# Altium footprint library TempdevAmmy.PcbLib: 42 footprints (part 3 of 3)
Each footprint in its own frame and in the unit in brackets; x right, y up, seen from the top. Pads: shape width x height; smd on the part's side, far side on the other; paste and mask are expansions set on the pad; w line width, h text height; cw(c..) or ccw(c..) is an arc to the next point about the centre after c.
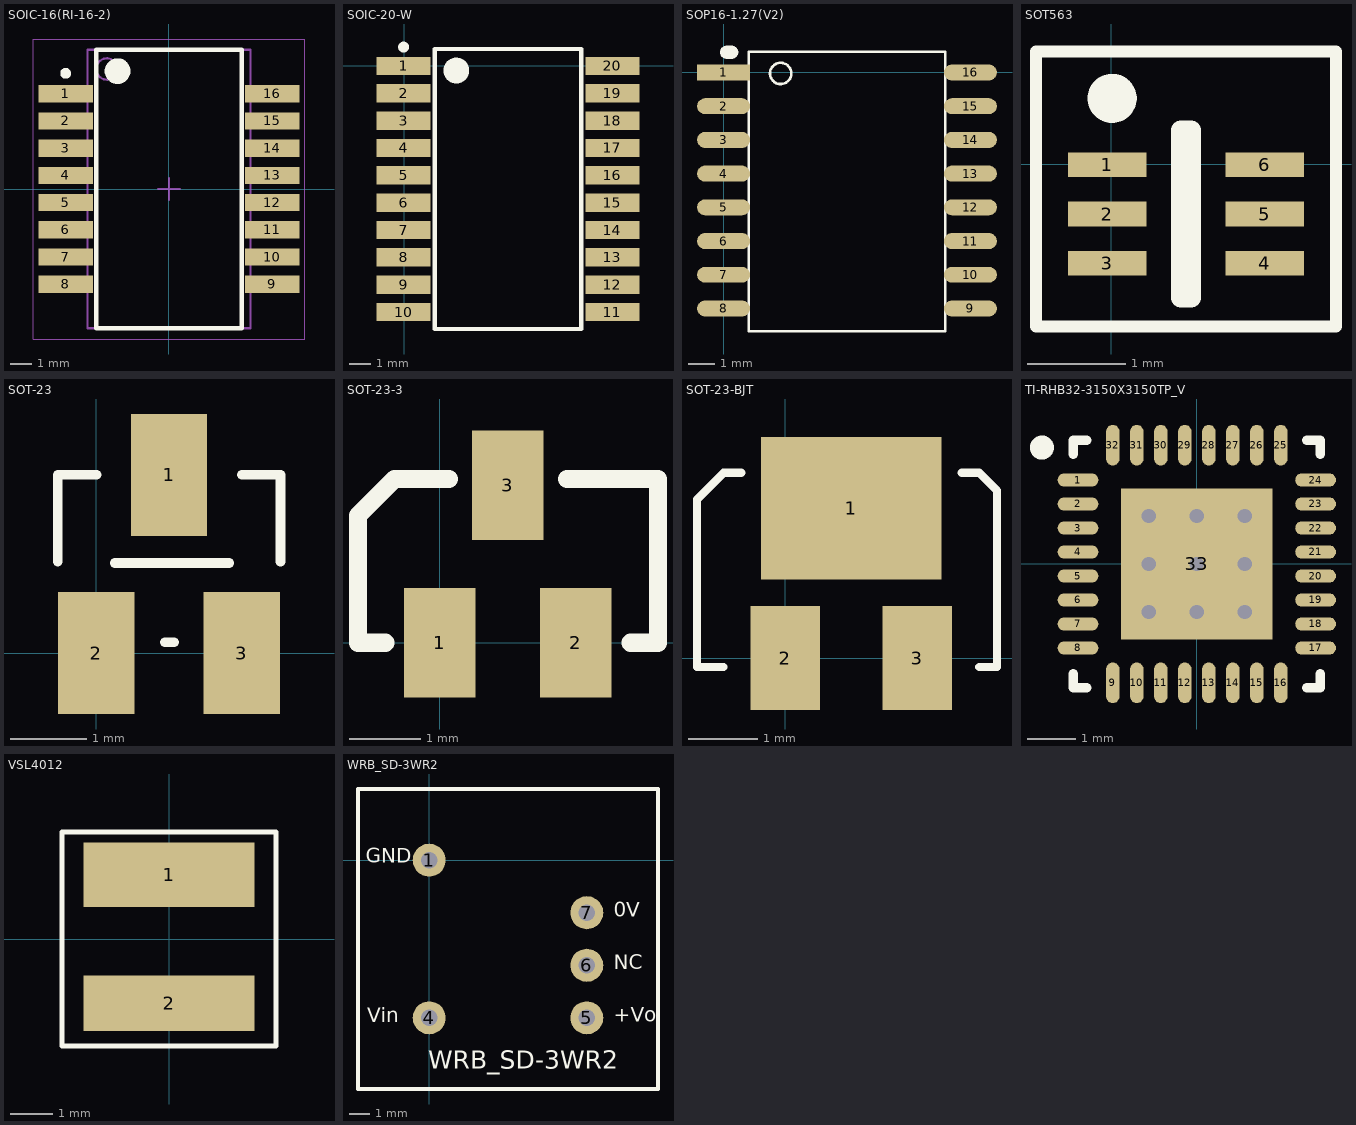
[diagram p2: the footprints below, top view; thin cyan lines are the x and y axes]

## SOIC-16(RI-16-2) [mm]
height 2.64
pads (16):
  rect 2.54x0.8 smd: 1(-4.825,4.445) 2(-4.825,3.175) 3(-4.825,1.905) 4(-4.825,0.635) 5(-4.825,-0.635) 6(-4.825,-1.905) 7(-4.825,-3.175) 8(-4.825,-4.445) 9(4.825,-4.445) 10(4.825,-3.175) 11(4.825,-1.905) 12(4.825,-0.635) 13(4.825,0.635) 14(4.825,1.905) 15(4.825,3.175) 16(4.825,4.445)
Top Overlay:
  circle w0.6: c-2.4,5.5 r0.3
  circle w0.25: c-4.825,5.395 r0.125
  lines w0.2: -3.4,-6.5 3.4,-6.5 3.4,6.5 -3.4,6.5 -3.4,-6.5
Mechanical 13:
  circle w0.1: c-2.9,5.6 r0.5
  lines w0.1: -3.8,-6.5 3.8,-6.5 3.8,6.5 -3.8,6.5 -3.8,-6.5
Mechanical 15:
  lines w0.05: -6.325,-7 6.325,-7 6.325,7 -6.325,7 -6.325,-7
  lines w0.1: -0.5,0 0.5,0 ; 0,-0.5 0,0.5
3D body "SOIC-16(RI-16-2).step": height 2.64, standoff 0, extent -5.15,-6.5 5.15,6.5

## SOIC-20-W [mm]
pads (20):
  rect 2.5x0.85 smd: 1(-0.024,0) 2(-0.024,-1.27) 3(-0.024,-2.54) 4(-0.024,-3.81) 5(-0.024,-5.08) 6(-0.024,-6.35) 7(-0.024,-7.62) 8(-0.024,-8.89) 9(-0.024,-10.16) 10(-0.024,-11.43) 11(9.676,-11.43) 12(9.676,-10.16) 13(9.676,-8.89) 14(9.676,-7.62) 15(9.676,-6.35) 16(9.676,-5.08) 17(9.676,-3.81) 18(9.676,-2.54) 19(9.676,-1.27) 20(9.676,0)
Top Overlay:
  circle w0.6: c2.426,-0.215 r0.3
  circle w0.25: c-0.024,0.875 r0.125
  lines w0.2: 1.426,-12.215 8.226,-12.215 8.226,0.785 1.426,0.785 1.426,-12.215

## SOP16-1.27(V2) [mm] "金升阳2"
pads (17):
  rect 2x0.6 smd: 1(0,0)
  oval 2x0.6 smd: 2(0,-1.27) 3(0,-2.54) 4(0,-3.81) 5(0,-5.08) 6(0,-6.35) 7(0,-7.62) 8(0,-8.89) 9(9.3,-8.89) 10(9.3,-7.62) 11(9.3,-6.35) 12(9.3,-5.08) 13(9.3,-3.81) 14(9.3,-2.54) 15(9.3,-1.27) 16(9.3,0)
  oval 0.7x0.5 on Top Overlay mask+0.051: ""(0.21,0.762)
Top Overlay:
  circle w0.1: c2.151,-0.037 r0.4
  lines w0.1: 0.95,-9.744 8.35,-9.744 8.35,0.785 0.95,0.785 0.95,-9.744

## SOT563 [mm]
pads (6):
  rect 0.8x0.25 smd: 1(-0.038,-0.008) 2(-0.038,-0.508) 3(-0.038,-1.008) 4(1.562,-1.008) 5(1.562,-0.508) 6(1.562,-0.008)
Top Overlay:
  circle w0.25: c0.012,0.667 r0.125
  lines w0.12: -0.762,-1.651 -0.762,1.143 2.286,1.143 2.286,-1.651 -0.762,-1.651
  lines w0.2: 0.712,-1.358 0.712,0.342 0.812,0.342 0.812,-1.358 0.712,-1.358
Mechanical 15:
  lines w0.1: 0.762,-1.008 0.762,-0.008

## SOT-23 [mm] "MMSS8050"
pads (3):
  rect 1x1.6 smd: 1(0.955,2.335) 2(0,0) 3(1.91,0)
Top Overlay:
  lines w0.127: -0.503,1.196 -0.503,2.339 0.005,2.339 ; 0.245,1.18 1.745,1.18 ; 0.898,0.14 1.025,0.14 ; 1.91,2.339 2.418,2.339 2.418,1.196

## SOT-23-3 [mm]
height 1.12
pads (3):
  rect 1x1.524 smd: 1(0,0) 2(1.9,0) 3(0.95,2.2)
Top Overlay:
  lines w0.254: -0.762,0 -1.143,0 -1.143,1.778 -0.635,2.286 0.127,2.286 ; 1.778,2.286 3.048,2.286 3.048,0 2.667,0
3D body "CircuitWorks-SOT-23.step": height 0.55, standoff -0.55, extent -0.55,-0.234 2.45,2.266

## SOT-23-BJT [mm]
pads (3):
  rect 2.6x2.05 smd: 1(0.95,2.159)
  rect 1x1.5 smd: 2(0,0) 3(1.9,0)
Top Overlay:
  lines w0.12: -0.889,-0.127 -1.27,-0.127 -1.27,2.286 -0.889,2.667 -0.635,2.667 ; 2.54,2.667 2.794,2.667 3.048,2.413 3.048,-0.127 2.794,-0.127

## TI-RHB32-3150X3150TP_V [mm]
pads (33):
  oval 0.85x0.28 smd: 1(-2.475,1.75) 2(-2.475,1.25) 3(-2.475,0.75) 4(-2.475,0.25) 5(-2.475,-0.25) 6(-2.475,-0.75) 7(-2.475,-1.25) 8(-2.475,-1.75) 17(2.475,-1.75) 18(2.475,-1.25) 19(2.475,-0.75) 20(2.475,-0.25) 21(2.475,0.25) 22(2.475,0.75) 23(2.475,1.25) 24(2.475,1.75)
  oval 0.28x0.85 smd: 9(-1.75,-2.475) 10(-1.25,-2.475) 11(-0.75,-2.475) 12(-0.25,-2.475) 13(0.25,-2.475) 14(0.75,-2.475) 15(1.25,-2.475) 16(1.75,-2.475) 25(1.75,2.475) 26(1.25,2.475) 27(0.75,2.475) 28(0.25,2.475) 29(-0.25,2.475) 30(-0.75,2.475) 31(-1.25,2.475) 32(-1.75,2.475)
  rect 3.15x3.15 smd: 33(0,0)
via 1,-1 diameter 0.5 hole 0.3
via 0,-1 diameter 0.5 hole 0.3
via -1,-1 diameter 0.5 hole 0.3
via 1,0 diameter 0.5 hole 0.3
via 0,0 diameter 0.5 hole 0.3
via -1,0 diameter 0.5 hole 0.3
via 1,1 diameter 0.5 hole 0.3
via 0,1 diameter 0.5 hole 0.3
via -1,1 diameter 0.5 hole 0.3
Top Overlay:
  circle w0.25: c-3.225,2.425 r0.125
  lines w0.2: -2.575,-2.29 -2.575,-2.575 -2.29,-2.575 ; -2.575,2.29 -2.575,2.575 -2.29,2.575 ; 2.29,-2.575 2.575,-2.575 2.575,-2.29 ; 2.29,2.575 2.575,2.575 2.575,2.29
Mechanical 15:
  lines w0.1: -0.5,0 0.5,0 ; 0,-0.5 0,0.5

## VSL4012 [mm]
pads (2):
  rect 4x1.5 smd: 1(0,1.5)
  rect 4x1.3 smd: 2(0,-1.5)
Top Overlay:
  lines w0.12: -2.5,-2.5 2.5,-2.5 2.5,2.5 -2.5,2.5 -2.5,-2.5

## WRB_SD-3WR2 [mm] "金升阳"
pads (5):
  round 1.6 hole 0.8: 1(0,0) 4(0,-7.62) 5(7.62,-7.62) 6(7.62,-5.08) 7(7.62,-2.54)
Top Overlay:
  lines w0.17: -3.44,-11.06 11.06,-11.06 11.06,3.44 -3.44,3.44 -3.44,-11.06
  text "+Vo" at 8.926,-8.061 h1.2
  text "NC" at 8.926,-5.522 h1.2
  text "0V" at 8.924,-2.983 h1.2
  text "Vin" at -2.986,-8.085 h1.2
  text "GND" at -3.057,-0.373 h1.2
  text "WRB_SD-3WR2" at -0.05,-10.361 h1.5